# Altium footprint library UWRT Footprint Library.PcbLib: 258 footprints (part 10 of 17)
Each footprint in its own frame and in the unit in brackets; x right, y up, seen from the top. Pads: shape width x height; smd on the part's side, far side on the other; paste and mask are expansions set on the pad; w line width, h text height; cw(c..) or ccw(c..) is an arc to the next point about the centre after c.
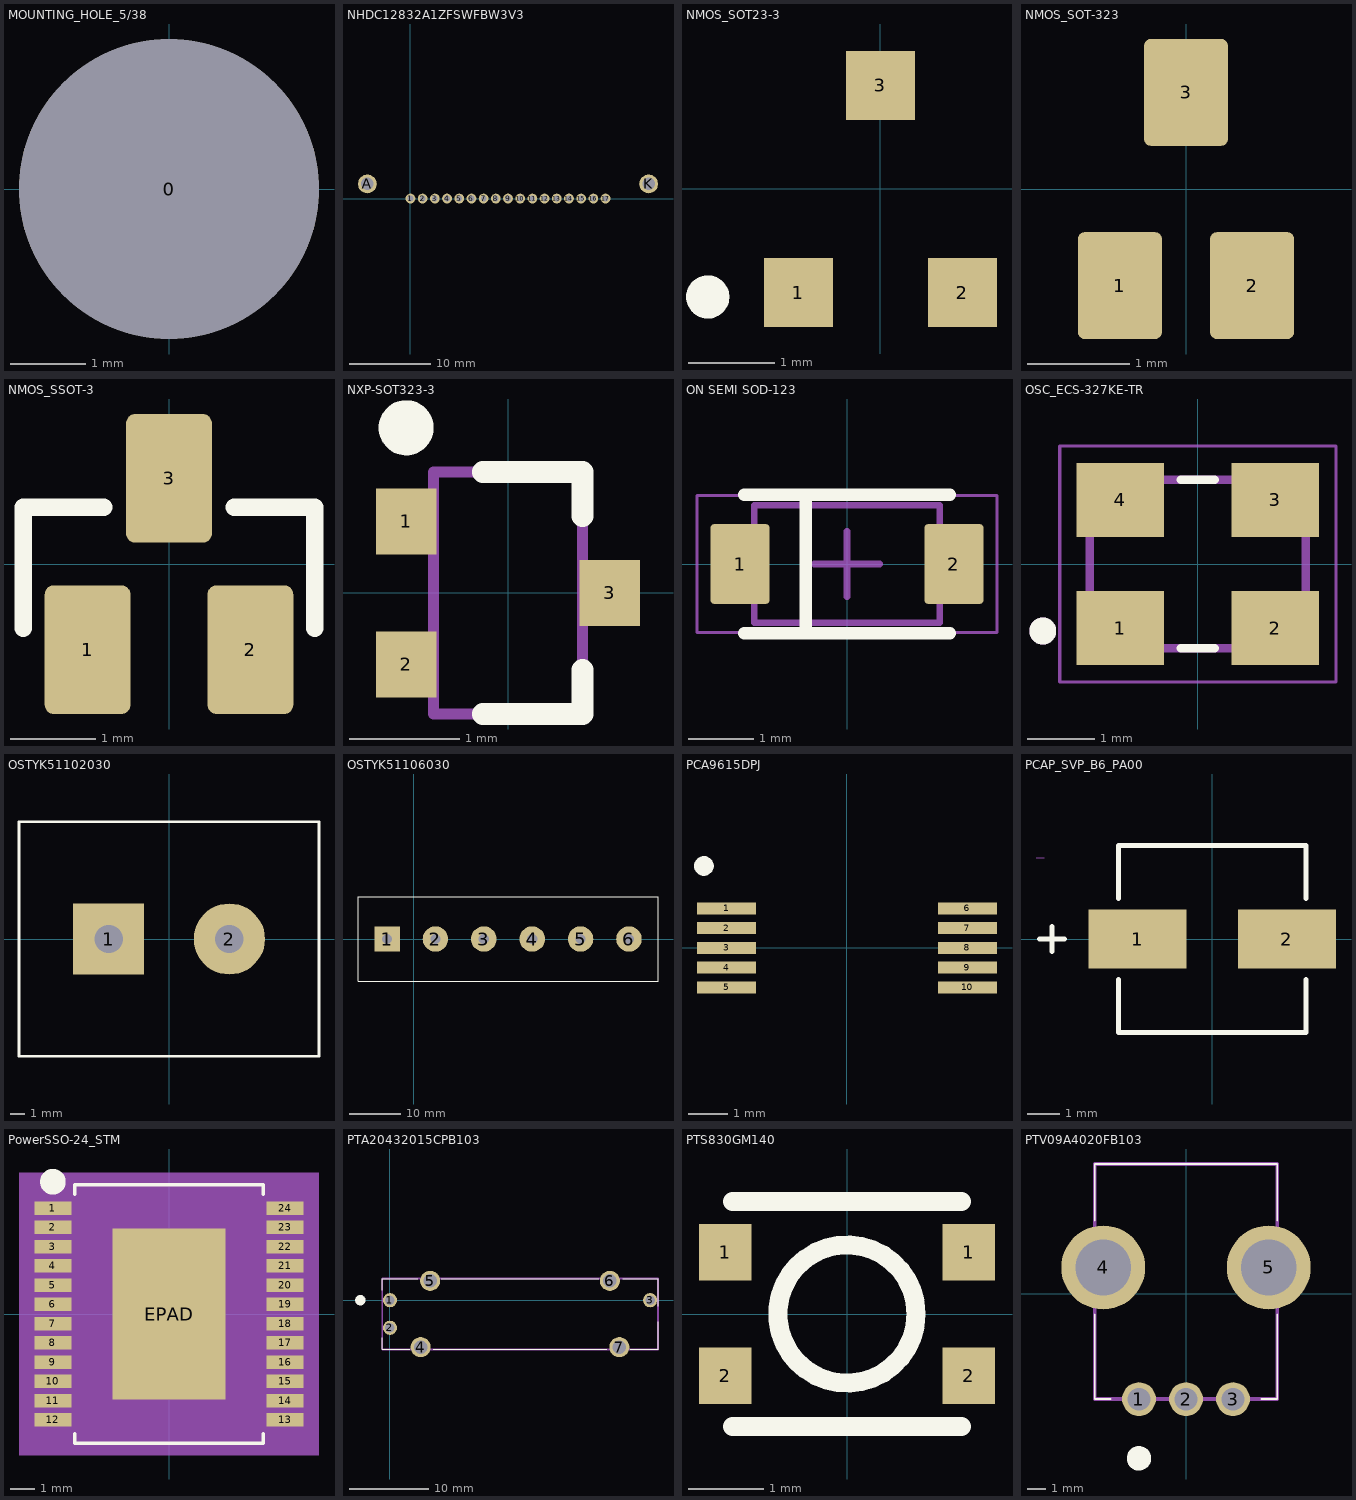
[diagram p9: the footprints below, top view; thin cyan lines are the x and y axes]

## MOUNTING_HOLE_5/38 [mm] "Meant to use with Mcmaster-carr PN: 91443A250"
pads (1):
  round 3.97 hole 3.97 unplated mask+0.3: 0(0,0)

## NHDC12832A1ZFSWFBW3V3 [mm]
pads (19):
  round 1.2 hole 0.7 mask+0.203: 1(0,0) 2(1.5,0) 3(3,0) 4(4.5,0) 5(6,0) 6(7.5,0) 7(9,0) 8(10.5,0) 9(12,0) 10(13.5,0) 11(15,0) 12(16.5,0) 13(18,0) 14(19.5,0) 15(21,0) 16(22.5,0) 17(24,0)
  round 2.31 / inner round 1.524 / far side round 2.31 hole 1.54 mask+0.203: A(-5.3,1.8) K(29.3,1.8)
3D body "NHD-C12832A1Z.STEP": height 4, standoff -3, extent -8.659,-0.72 32.741,23.58

## NMOS_SOT23-3 [mm] "SOT23, 3 pins, Body 2.90mm x 2.80mm"
height 1.1
pads (3):
  rect 0.8x0.8 smd: 1(-0.95,-1.2) 2(0.95,-1.2) 3(0,1.2)
Top Overlay:
  circle w0.25: c-2,-1.25 r0.125
3D body "User Library-3-lead sot23-3.step": height 1, standoff -0.02, extent -1.46,-1.25 1.46,1.226

## NMOS_SOT-323 [mm]
pads (3):
  rrect15% 0.825x1.05 smd: 1(-0.65,-0.95) 2(0.65,-0.95) 3(0,0.95)
3D body "DMN3067LW-7.stp": height 1.1, standoff 0, extent -1,-1.05 1,1.05

## NMOS_SSOT-3 [mm] "FDN337N"
pads (3):
  rrect20% 1x1.5 smd: 1(-0.95,-1) 2(0.95,-1) 3(0,1)
Top Overlay:
  lines w0.203: -1.7,-0.75 -1.7,0.66 -0.764,0.66 ; 0.764,0.66 1.7,0.66 1.7,-0.75
3D body "NDS355AN--3DModel-STEP-56544.STEP": height 1.12, standoff 0, extent -1.46,-1.407 1.46,1.103

## NXP-SOT323-3 [mm] "SOT23, 3-Leads, Body 2.2x1.35mm, Pitch 0.65mm"
height 1.1
pads (3):
  rect 0.55x0.6 smd paste-1: 1(-0.925,0.65) 2(-0.925,-0.65) 3(0.925,0)
Top Overlay:
  circle w0.25: c-0.925,1.5 r0.125
  lines w0.2: -0.225,-1.1 0.675,-1.1 0.675,-0.7 ; -0.225,1.1 0.675,1.1 0.675,0.7
Top Paste:
  rectangle: 0.65,-0.25 1.2,0.25
  rectangle: -1.2,-0.9 -0.65,-0.4
  rectangle: -1.2,0.4 -0.65,0.9
Mechanical 13:
  lines w0.1: -0.675,-1.1 -0.675,1.1 0.675,1.1 0.675,-1.1 -0.675,-1.1
3D body "SOT65P210X110-3L.step": height 1.1, standoff 0, extent -1.15,-1.1 1.15,1.1

## ON SEMI SOD-123 [mm]
pads (2):
  rrect12% 0.91x1.22 smd: 1(-1.64,0) 2(1.64,0)
Top Overlay:
  lines w0.191: -1.579,-1.059 1.579,-1.059 ; -1.579,1.059 1.579,1.059 ; -0.635,-1.059 -0.635,1.059
Mechanical 1:
  lines w0.1: -1.42,-0.9 1.42,-0.9 1.42,0.9 -1.42,0.9 -1.42,-0.9
Mechanical 15:
  lines w0.05: -2.3,-1.05 2.3,-1.05 2.3,1.05 -2.3,1.05 -2.3,-1.05
  lines w0.1: -0.5,0 0.5,0 ; 0,-0.5 0,0.5
3D body "SODFL371X135-2N.step": height 1.35, standoff 0, extent -1.855,-0.9 1.855,0.9

## OSC_ECS-327KE-TR [mm]
pads (4):
  rect 1.3x1.1 smd: 1(-1.15,-0.95) 2(1.15,-0.95) 3(1.15,0.95) 4(-1.15,0.95)
Top Overlay:
  circle w0.2: c-2.3,-0.994 r0.1
  lines w0.127: -0.25,-1.25 0.25,-1.25 ; -0.25,1.25 0.25,1.25
Mechanical 13:
  circle w0.2: c-2.3,-0.994 r0.1
  lines w0.127: -1.6,-1.25 -1.6,1.25 1.6,1.25 1.6,-1.25 -1.6,-1.25
Mechanical 15:
  lines w0.05: -2.05,-1.75 2.05,-1.75 2.05,1.75 -2.05,1.75 -2.05,-1.75
3D body "ECS-327KE-TR--3DModel-STEP-40055.STEP": height 1, standoff 0, extent -1.6,-1.25 1.6,1.25

## OSTYK51102030 [mm] "Connector; Header; 2 Position"
pads (2):
  rect 5x5 hole 2: 1(-4.25,0)
  round 5 hole 2: 2(4.25,0)
Top Overlay:
  lines w0.2: -10.55,-8.25 -10.55,8.25 10.55,8.25 10.55,-8.25 -10.55,-8.25

## OSTYK51106030 [mm] "Connector; Header; 6 Position"
pads (6):
  rect 5x5 hole 2: 1(-5.25,0)
  round 5 hole 2: 2(4.25,0) 3(13.75,0) 4(23.25,0) 5(32.75,0) 6(42.25,0)
Top Overlay:
  lines w0.2: -10.95,-8.25 -10.95,8.25 47.95,8.25 47.95,-8.25 -10.95,-8.25
3D body "OSTYK51106030.stp": height 18.49, standoff -5.01, extent -10.907,-8.25 48.093,8.25

## PCA9615DPJ [mm] "TSSOP-10"
height 1.1
pads (10):
  rect 1.5x0.3 smd mask+0.05: 1(-3.05,1) 2(-3.05,0.5) 3(-3.05,0) 4(-3.05,-0.5) 5(-3.05,-1) 6(3.05,1) 7(3.05,0.5) 8(3.05,0) 9(3.05,-0.5) 10(3.05,-1)
Top Overlay:
  circle w0.25: c-3.625,2.075 r0.125
3D body "User Library-TSSOP-10 3_1x4_4.STEP": height 1.09, standoff -0.01, extent -3.2,-1.55 3.2,1.55

## PCAP_SVP_B6_PA00 [mil]
pads (2):
  rect 119x72 smd paste+0 mask+0: 1(-90.5,0) 2(90.5,0)
Top Overlay:
  lines w6: -209,0 -179,0 ; -194,-15 -194,15 ; -113.5,-49.1 -113.5,-113.5 113.5,-113.5 113.5,-49.1 ; -113.5,49.1 -113.5,113.5 113.5,113.5 113.5,49.1
Mechanical 7:
  lines w1: -213.5,98.5 -203.5,98.5
Mechanical 13:
  lines w1: -209,0 -179,0 ; -194,-15 -194,15
3D body: height 10, standoff 0, extent 0,0 10,10
3D body "PCAP_SVP_B6_PAN-M.step": height 238.11, standoff 0, extent -124.01,-110 120,107

## PowerSSO-24_STM [mil] "Power Switch/Driver 1:1 N-Channel 13.5A PowerSSO-24"
pads (25):
  rect 61x22 smd paste+0 mask+0: 1(-190,173.23) 2(-190,141.73) 3(-190,110.24) 4(-190,78.74) 5(-190,47.24) 6(-190,15.75) 7(-190,-15.75) 8(-190,-47.24) 9(-190,-78.74) 10(-190,-110.24) 11(-190,-141.73) 12(-190,-173.23) 13(190,-173.23) 14(190,-141.73) 15(190,-110.24) 16(190,-78.74) 17(190,-47.24) 18(190,-15.75) 19(190,15.75) 20(190,47.24) 21(190,78.74) 22(190,110.24) 23(190,141.73) 24(190,173.23)
  rect 185x280 smd paste-139.5 mask+0: EPAD(0,0)
Top Overlay:
  circle w22: c-190,216.5 r10
  lines w6: -154.5,-196.34 -154.5,-211.5 154.5,-211.5 154.5,-196.34 ; -154.5,196.34 -154.5,211.5 154.5,211.5 154.5,196.34
Top Paste:
  region: 88.56,-87.94 34.77,-87.94 34.77,-136.06 88.56,-136.06
  region: 88.56,-31.94 34.77,-31.94 34.77,-80.06 88.56,-80.06
  region: 88.56,24.06 34.77,24.06 34.77,-24.06 88.56,-24.06
  region: 88.56,80.06 34.77,80.06 34.77,31.94 88.56,31.94
  region: 88.56,136.06 34.77,136.06 34.77,87.94 88.56,87.94
  region: 26.9,-87.94 -26.9,-87.94 -26.9,-136.06 26.9,-136.06
  region: 26.9,-31.94 -26.9,-31.94 -26.9,-80.06 26.9,-80.06
  region: 26.9,24.06 -26.9,24.06 -26.9,-24.06 26.9,-24.06
  region: 26.9,80.06 -26.9,80.06 -26.9,31.94 26.9,31.94
  region: 26.9,136.06 -26.9,136.06 -26.9,87.94 26.9,87.94
  region: -34.77,-87.94 -88.56,-87.94 -88.56,-136.06 -34.77,-136.06
  region: -34.77,-31.94 -88.56,-31.94 -88.56,-80.06 -34.77,-80.06
  region: -34.77,24.06 -88.56,24.06 -88.56,-24.06 -34.77,-24.06
  region: -34.77,80.06 -88.56,80.06 -88.56,31.94 -34.77,31.94
  region: -34.77,136.06 -88.56,136.06 -88.56,87.94 -34.77,87.94
Mechanical 5:
  region: 245.5,-231.5 -245.5,-231.5 -245.5,231.5 245.5,231.5
Mechanical 13:
  lines w0: -12,206.5 ccw(c0,206.5) 12,206.5
  lines w1: -206.5,-183.23 -149.5,-183.23 -149.5,-163.23 -206.5,-163.23 -206.5,-183.23 ; -206.5,-151.73 -149.5,-151.73 -149.5,-131.73 -206.5,-131.73 -206.5,-151.73 ; -206.5,-120.24 -149.5,-120.24 -149.5,-100.24 -206.5,-100.24 -206.5,-120.24 ; -206.5,-88.74 -149.5,-88.74 -149.5,-68.74 -206.5,-68.74 -206.5,-88.74 ; -206.5,-57.24 -149.5,-57.24 -149.5,-37.24 -206.5,-37.24 -206.5,-57.24 ; -206.5,-25.75 -149.5,-25.75 -149.5,-5.75 -206.5,-5.75 -206.5,-25.75 ; -206.5,5.75 -149.5,5.75 -149.5,25.75 -206.5,25.75 -206.5,5.75 ; -206.5,37.24 -149.5,37.24 -149.5,57.24 -206.5,57.24 -206.5,37.24 ; -206.5,68.74 -149.5,68.74 -149.5,88.74 -206.5,88.74 -206.5,68.74 ; -206.5,100.24 -149.5,100.24 -149.5,120.24 -206.5,120.24 -206.5,100.24 ; -206.5,131.73 -149.5,131.73 -149.5,151.73 -206.5,151.73 -206.5,131.73 ; -206.5,163.23 -149.5,163.23 -149.5,183.23 -206.5,183.23 -206.5,163.23 ; -149.5,-206.5 -149.5,206.5 149.5,206.5 149.5,-206.5 -149.5,-206.5 ; 149.5,-183.23 206.5,-183.23 206.5,-163.23 149.5,-163.23 149.5,-183.23 ; 149.5,-151.73 206.5,-151.73 206.5,-131.73 149.5,-131.73 149.5,-151.73 ; 149.5,-120.24 206.5,-120.24 206.5,-100.24 149.5,-100.24 149.5,-120.24 ; 149.5,-88.74 206.5,-88.74 206.5,-68.74 149.5,-68.74 149.5,-88.74 ; 149.5,-57.24 206.5,-57.24 206.5,-37.24 149.5,-37.24 149.5,-57.24 ; 149.5,-25.75 206.5,-25.75 206.5,-5.75 149.5,-5.75 149.5,-25.75 ; 149.5,5.75 206.5,5.75 206.5,25.75 149.5,25.75 149.5,5.75 ; 149.5,37.24 206.5,37.24 206.5,57.24 149.5,57.24 149.5,37.24 ; 149.5,68.74 206.5,68.74 206.5,88.74 149.5,88.74 149.5,68.74 ; 149.5,100.24 206.5,100.24 206.5,120.24 149.5,120.24 149.5,100.24 ; 149.5,131.73 206.5,131.73 206.5,151.73 149.5,151.73 149.5,131.73 ; 149.5,163.23 206.5,163.23 206.5,183.23 149.5,183.23 149.5,163.23
  text "*" at -147,153.5 h50
Mechanical 15:
  region: -159.5,-194.23 -230.5,-194.23 -230.5,194.23 -159.5,194.23 -159.5,216.5 159.5,216.5 159.5,194.23 230.5,194.23 230.5,-194.23 159.5,-194.23 159.5,-216.5 -159.5,-216.5
  lines w6: -230.5,-194.23 -159.5,-194.23 -159.5,-216.5 159.5,-216.5 159.5,-194.23 230.5,-194.23 230.5,194.23 159.5,194.23 159.5,216.5 -159.5,216.5 -159.5,194.23 -230.5,194.23 -230.5,-194.23
3D body: height 10, standoff 0, extent 0,0 10,10
3D body "SOIC_160AK-E_STM.step": height 96.1, standoff -2.01, extent -206.69,-206.49 206.7,206.51

## PTA20432015CPB103 [mm]
pads (7):
  round 1.8 hole 1.2: 1(0,0) 2(0,-3.5) 3(33,0)
  round 2.55 hole 1.7: 4(3.9,-5.95) 5(5.1,2.45) 6(27.9,2.45) 7(29.1,-5.95)
Top Overlay:
  circle w0.7: c-3.75,0 r0.3
  lines w0.1: -1,-4.75 -1,-6.25 2.5,-6.25 ; -1,1.25 -1,2.75 3.5,2.75 ; 5.5,-6.25 27.5,-6.25 ; 6.5,2.75 26.5,2.75 ; 29.5,2.75 34,2.75 34,-0.75 ; 30.5,-6.25 34,-6.25 34,-2.75
Mechanical 13:
  lines w0.2: -1,-6.25 -1,2.75 34,2.75 34,-6.25 -1,-6.25
3D body "PTA2043-2015CPB103.stp": height 6.6, standoff -5, extent -1,-6.699 34,3.199

## PTS830GM140 [mm] "PWR TACTILE SWITCH (RED)"
pads (4):
  rect 0.7x0.75 smd: 1(-1.625,0.825) 1(1.625,0.825) 2(-1.625,-0.825) 2(1.625,-0.825)
Top Overlay:
  circle w0.254: c0,0 r0.922
  lines w0.254: -1.525,-1.5 1.525,-1.5 ; -1.525,1.5 1.525,1.5
3D body "PTS830GM140GSMTRLFS.stp": height 1.35, standoff -0.05, extent -1.75,-1.3 1.75,1.3

## PTV09A4020FB103 [mm]
pads (5):
  round 1.8 hole 1.2: 1(-2.5,-5.6) 2(0,-5.6) 3(2.5,-5.6)
  round 4.46 hole 2.973: 4(-4.4,1.4) 5(4.4,1.4)
Top Overlay:
  circle w0.7: c-2.5,-8.75 r0.3
  lines w0.1: -4.85,-1.1 -4.85,-5.6 -4,-5.6 ; -4.85,3.9 -4.85,6.9 4.85,6.9 4.85,3.9 ; 4,-5.6 4.85,-5.6 4.85,-1.1
Mechanical 13:
  lines w0.2: -4.85,-5.6 -4.85,6.9 4.85,6.9 4.85,-5.6 -4.85,-5.6
3D body "PTV09A-4025U-B103.stp": height 20.09, standoff -5, extent -4.949,-5.805 5.025,6.965